# Altium schematic symbol library SparkFun.SCHLIB: 796 symbols (part 1 of 5)
Pins are listed as number, name and electrical type; pins without a type are passive.

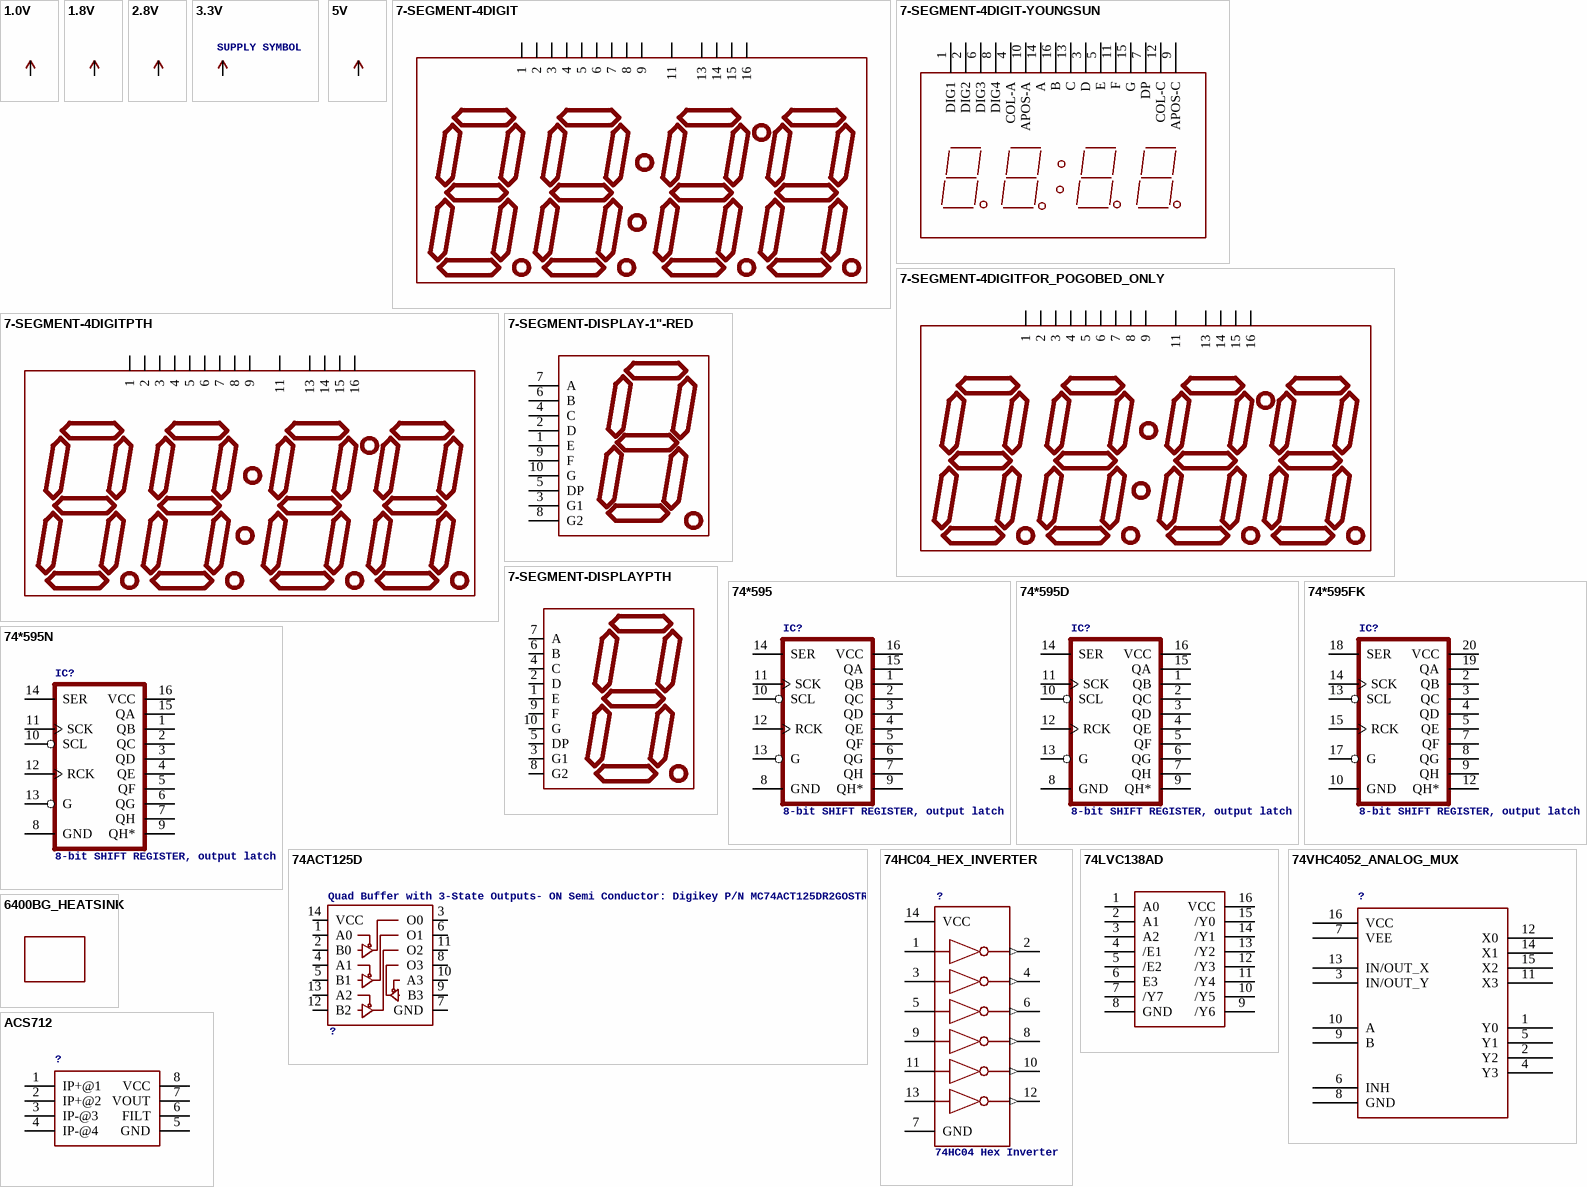
[diagram p0: symbols 1.0V to ACS712]

## 1.0V
designator ?
pins: ?1 1.0V (oe)

## 1.8V
designator ?
pins: ?1 1.8V (oe)

## 2.8V
designator ?
pins: ?1 2.8V (oe)

## 3.3V
designator P+?, comment SUPPLY SYMBOL
pins: ?1 3.3V (oe)

## 5V
designator ?
pins: ?1 5V (oe)

## 7-SEGMENT-4DIGIT
designator ?
footprint 7-SEGMENT-4DIGIT-YOUNGSUN
pins: 1, 2, 3, 4, 5, 6, 7, 8, 9, 11, 13, 14, 15, 16

## 7-SEGMENT-4DIGIT-YOUNGSUN
designator ?, comment This is a part for the 4-Digit 7-segment LEDs from Young Sun.  Different from the Digikey LEDs, all 16 pins are used.  (value not drawn)
footprint 7-SEGMENT-4DIGIT-YOUNGSUN
pins: 1 DIG1, 2 DIG2, 3 D, 4 COL-A, 5 E, 6 DIG3, 7 DP, 8 DIG4, 9 APOS-C, 10 APOS-A, 11 F, 12 COL-C, 13 C, 14 A, 15 G, 16 B

## 7-SEGMENT-4DIGITFOR_POGOBED_ONLY
designator ?
footprint 7-SEGMENT-4DIGIT_LONGPADS_FOR_POGOBED
pins: 1, 2, 3, 4, 5, 6, 7, 8, 9, 11, 13, 14, 15, 16

## 7-SEGMENT-4DIGITPTH
designator ?
footprint 7-SEGMENT-4DIGIT
pins: 1, 2, 3, 4, 5, 6, 7, 8, 9, 11, 13, 14, 15, 16

## 7-SEGMENT-DISPLAY-1"-RED
designator ?, comment 7-Segment Display 1" Red (COM-08546)  (value not drawn)
footprint 7-SEGMENT-1"PTH
pins: 1 E, 2 D, 3 G1, 4 C, 5 DP, 6 B, 7 A, 8 G2, 9 F, 10 G

## 7-SEGMENT-DISPLAYPTH
designator ?
footprint 7-SEGMENT-DISPLAY
pins: 1 E, 2 D, 3 G1, 4 C, 5 DP, 6 B, 7 A, 8 G2, 9 F, 10 G

## 74*595
designator IC?, comment 8-bit SHIFT REGISTER, output latch
footprint TSSOP16
pins: 1 QB (hiz), 2 QC (hiz), 3 QD (hiz), 4 QE (hiz), 5 QF (hiz), 6 QG (hiz), 7 QH (hiz), 8 GND (power), 9 QH* (hiz), 10 SCL, 11 SCK, 12 RCK, 13 G, 14 SER, 15 QA (hiz), 16 VCC (power)

## 74*595D
designator IC?, comment 8-bit SHIFT REGISTER, output latch
footprint SO16
pins: 1 QB (hiz), 2 QC (hiz), 3 QD (hiz), 4 QE (hiz), 5 QF (hiz), 6 QG (hiz), 7 QH (hiz), 8 GND (power), 9 QH* (hiz), 10 SCL, 11 SCK, 12 RCK, 13 G, 14 SER, 15 QA (hiz), 16 VCC (power)

## 74*595FK
designator IC?, comment 8-bit SHIFT REGISTER, output latch
footprint LCC20
pins: 2 QB (hiz), 3 QC (hiz), 4 QD (hiz), 5 QE (hiz), 7 QF (hiz), 8 QG (hiz), 9 QH (hiz), 10 GND (power), 12 QH* (hiz), 13 SCL, 14 SCK, 15 RCK, 17 G, 18 SER, 19 QA (hiz), 20 VCC (power)

## 74*595N
designator IC?, comment 8-bit SHIFT REGISTER, output latch
footprint DIL16
pins: 1 QB (hiz), 2 QC (hiz), 3 QD (hiz), 4 QE (hiz), 5 QF (hiz), 6 QG (hiz), 7 QH (hiz), 8 GND (power), 9 QH* (hiz), 10 SCL, 11 SCK, 12 RCK, 13 G, 14 SER, 15 QA (hiz), 16 VCC (power)

## 74ACT125D
designator ?, comment Quad Buffer with 3-State Outputs- ON Semi Conductor: Digikey P/N MC74ACT125DR2GOSTR-ND
footprint SO014
pins: 1 A0, 2 B0, 3 O0, 4 A1, 5 B1, 6 O1, 7 GND, 8 O3, 9 B3, 10 A3, 11 O2, 12 B2, 13 A2, 14 VCC

## 74HC04_HEX_INVERTER
designator ?, comment 74HC04 Hex Inverter
footprint DIL14
pins: 1 1A, 2 1Y (out), 3 2A, 4 2Y (out), 5 3A, 6 3Y (out), 7 GND (power), 8 4Y (out), 9 4A, 10 5Y (out), 11 5A, 12 6Y (out), 13 6A, 14 VCC (power)

## 74LVC138AD
designator ?
footprint SO016
pins: 1 A0, 2 A1, 3 A2, 4 /E1, 5 /E2, 6 E3, 7 /Y7, 8 GND, 9 /Y6, 10 /Y5, 11 /Y4, 12 /Y3, 13 /Y2, 14 /Y1, 15 /Y0, 16 VCC

## 74VHC4052_ANALOG_MUX
designator ?
footprint TSSOP16
pins: 1 Y0, 2 Y2, 3 IN/OUT_Y, 4 Y3, 5 Y1, 6 INH, 7 VEE, 8 GND, 9 B, 10 A, 11 X3, 12 X0, 13 IN/OUT_X, 14 X1, 15 X2, 16 VCC

## 6400BG_HEATSINK
designator ?
footprint 6400BG_HEATSINK

## ACS712
designator ?
footprint SO08
pins: 1 IP+@1, 2 IP+@2, 3 IP-@3, 4 IP-@4, 5 GND, 6 FILT, 7 VOUT, 8 VCC

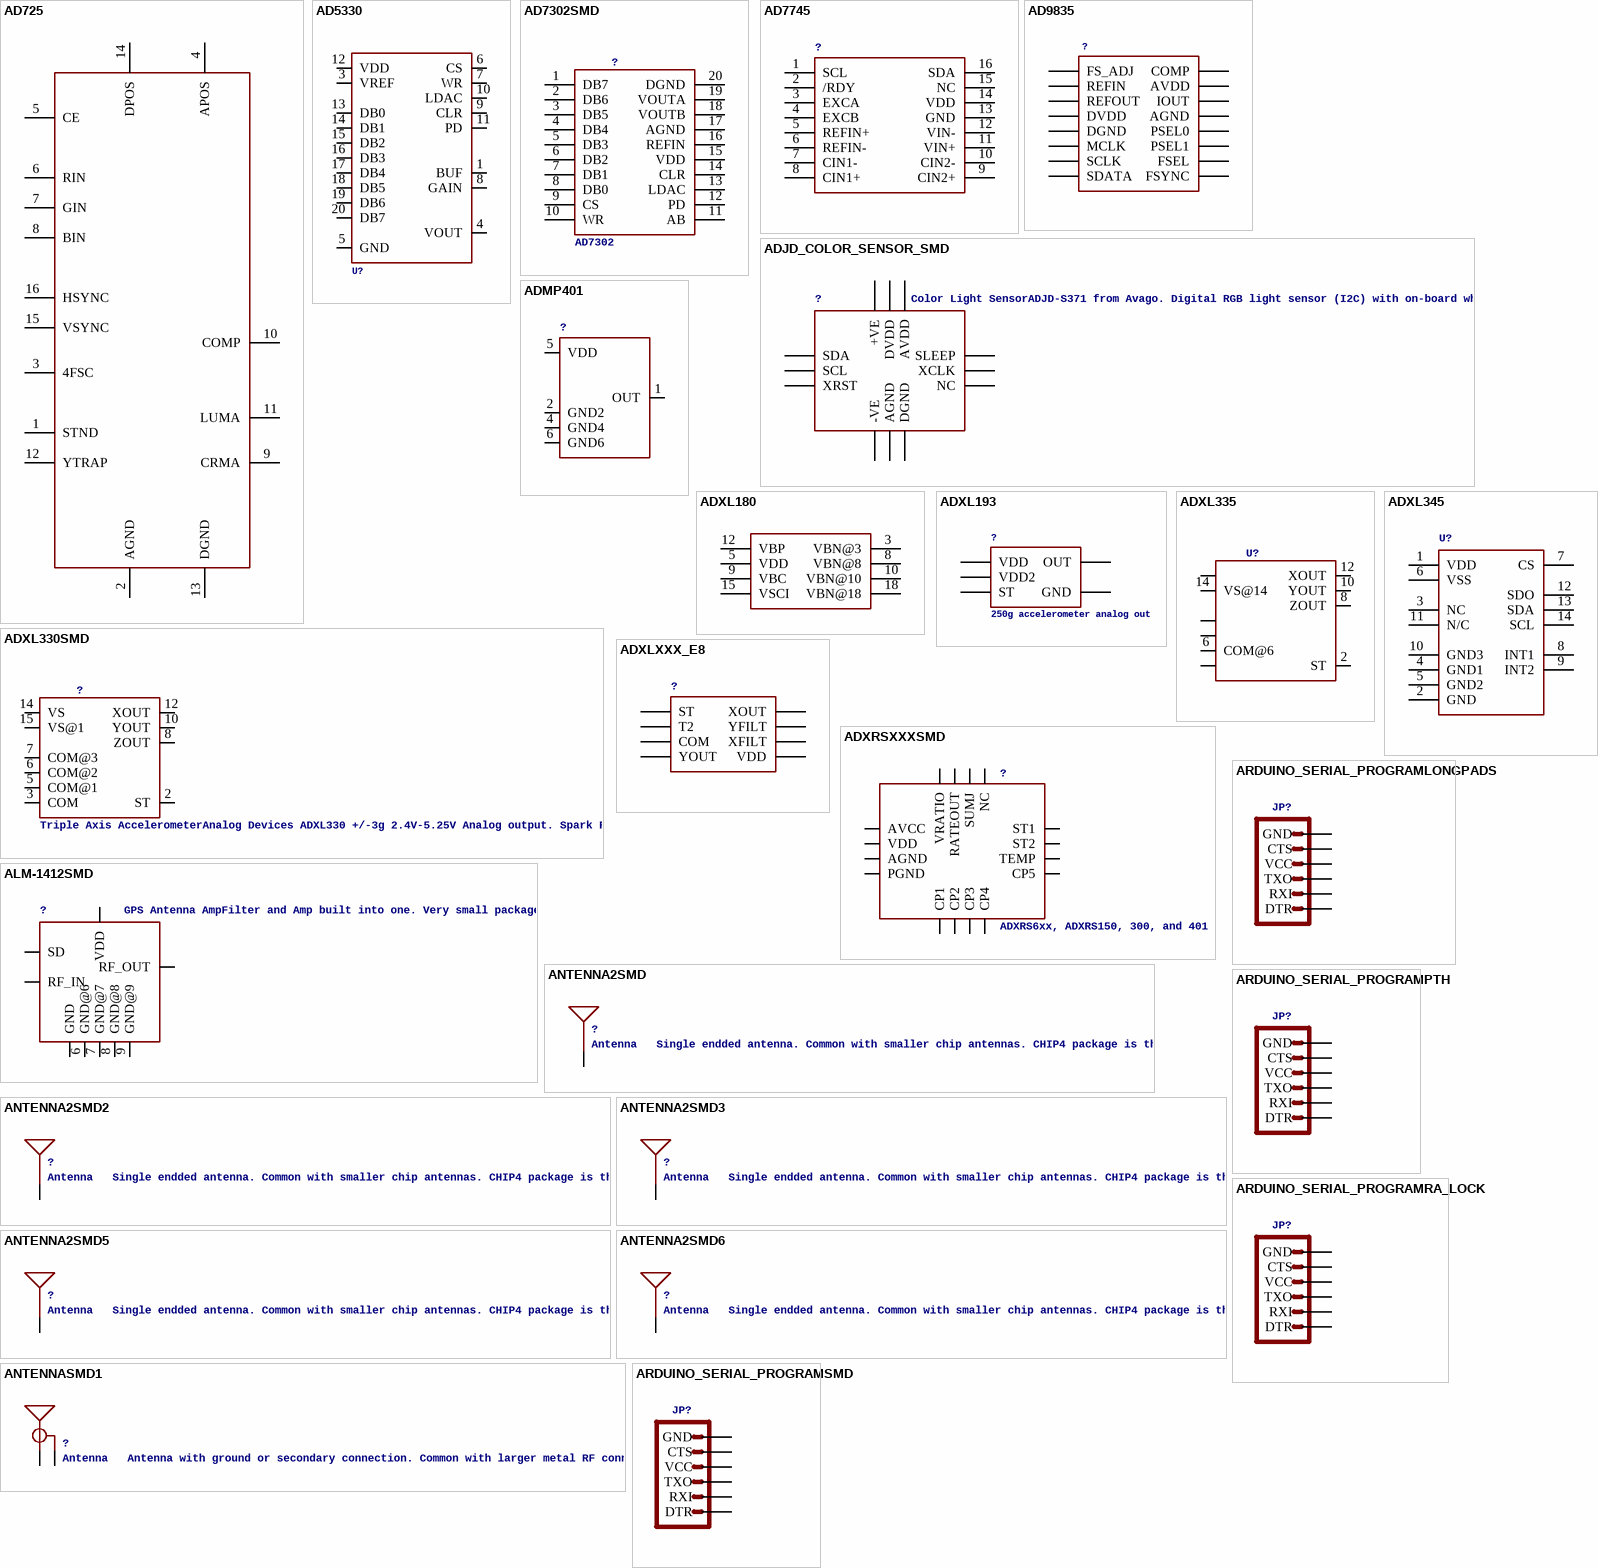
[diagram p1: symbols AD725 to ARDUINO_SERIAL_PROGRAMSMD]

## AD725
designator ?
footprint SO16L
pins: 1 STND, 2 AGND, 3 4FSC, 4 APOS, 5 CE, 6 RIN, 7 GIN, 8 BIN, 9 CRMA, 10 COMP, 11 LUMA, 12 YTRAP, 13 DGND, 14 DPOS, 15 VSYNC, 16 HSYNC

## AD5330
designator U?
footprint TSSOP20
pins: 1 BUF, 3 VREF, 4 VOUT, 5 GND, 6 CS, 7 WR, 8 GAIN, 9 CLR, 10 LDAC, 11 PD, 12 VDD, 13 DB0, 14 DB1, 15 DB2, 16 DB3, 17 DB4, 18 DB5, 19 DB6, 20 DB7

## AD7302SMD
designator ?, comment AD7302
footprint TSSOP20
pins: 1 DB7, 2 DB6, 3 DB5, 4 DB4, 5 DB3, 6 DB2, 7 DB1, 8 DB0, 9 CS, 10 WR, 11 AB, 12 PD, 13 LDAC, 14 CLR, 15 VDD, 16 REFIN, 17 AGND, 18 VOUTB, 19 VOUTA, 20 DGND

## AD7745
designator ?
footprint TSSOP16
pins: 1 SCL, 2 /RDY, 3 EXCA, 4 EXCB, 5 REFIN+, 6 REFIN-, 7 CIN1-, 8 CIN1+, 9 CIN2+, 10 CIN2-, 11 VIN+, 12 VIN-, 13 GND, 14 VDD, 15 NC, 16 SDA

## AD9835
designator ?
footprint TSSOP16
pins: 1 FS_ADJ, 2 REFIN, 3 REFOUT, 4 DVDD, 5 DGND, 6 MCLK, 7 SCLK, 8 SDATA, 9 FSYNC, 10 FSEL, 11 PSEL1, 12 PSEL0, 13 AGND, 14 IOUT, 15 AVDD, 16 COMP

## ADJD_COLOR_SENSOR_SMD
designator ?, comment Color Light SensorADJD-S371 from Avago. Digital RGB light sensor (I2C) with on-board white LED. Not quite proven footprint or schematic component. SKU: COM-08618
footprint ADJD-S371
pins: 1 -VE, 2 NC, 3 +VE, 4 SDA, 5 DVDD, 6 SCL, 7 AVDD, 8 SLEEP, 9 AGND, 10 XRST, 11 DGND, 12 XCLK

## ADMP401
designator ?
footprint ADMP401
pins: 1 OUT, 2 GND2, 4 GND4, 5 VDD, 6 GND6

## ADXL180
designator ?
footprint ADXL180
pins: 3 VBN@3, 5 VDD, 8 VBN@8, 9 VBC, 10 VBN@10, 12 VBP, 15 VSCI, 18 VBN@18

## ADXL193
designator ?, comment 250g accelerometer analog out
footprint ADXL193
pins: P$3 GND, P$4 ST, P$6 OUT, P$7 VDD, P$8 VDD2

## ADXL330SMD
designator ?, comment Triple Axis AccelerometerAnalog Devices ADXL330 +/-3g 2.4V-5.25V Analog output. Spark Fun Electronics SKU : COM-00730. Center pad paste layer has been reduced to avoid shorting.
footprint LFCSP-16
pins: 2 ST, 3 COM, 5 COM@1, 6 COM@2, 7 COM@3, 8 ZOUT, 10 YOUT, 12 XOUT, 14 VS, 15 VS@1

## ADXL335
designator U?
footprint LFCSP-16
pins: 2 ST, 3 COM@3, 5 COM@5, 6 COM@6, 7 COM@7, 8 ZOUT, 10 YOUT, 12 XOUT, 14 VS@14, 15 VS@15

## ADXL345
designator U?
footprint LGA14
pins: 1 VDD, 2 GND, 3 NC, 4 GND1, 5 GND2, 6 VSS, 7 CS, 8 INT1, 9 INT2, 10 GND3, 11 N/C, 12 SDO, 13 SDA, 14 SCL

## ADXLXXX_E8
designator ?
footprint ADXLXXX_E8
pins: P$1 ST, P$2 T2, P$3 COM, P$4 YOUT, P$5 XOUT, P$6 YFILT, P$7 XFILT, P$8 VDD

## ADXRSXXXSMD
designator ?, comment ADXRS6xx, ADXRS150, 300, and 401
footprint BC-32
pins: AGND, AVCC, CP1, CP2, CP3, CP4, CP5, NC, PGND, RATEOUT, ST1, ST2, SUMJ, TEMP, VDD, VRATIO

## ALM-1412SMD
designator ?, comment GPS Antenna AmpFilter and Amp built into one. Very small package.
footprint ALM-1412
pins: 1 SD, 2 GND, 3 RF_OUT, 4 VDD, 5 RF_IN, 6 GND@6, 7 GND@7, 8 GND@8, 9 GND@9

## ANTENNA2SMD
designator ?, comment Antenna   Single endded antenna. Common with smaller chip antennas. CHIP4 package is the GPS Chip Antenna SKU: GPS-08418. CHIP5 package is 2.4GHz chip antenna SKU: WRL-00144.
footprint ANTENNA-CHIP2
pins: FEED SIGNAL

## ANTENNA2SMD2
designator ?, comment Antenna   Single endded antenna. Common with smaller chip antennas. CHIP4 package is the GPS Chip Antenna SKU: GPS-08418. CHIP5 package is 2.4GHz chip antenna SKU: WRL-00144.
footprint ANTENNA-CHIP3
pins: FEED SIGNAL

## ANTENNA2SMD3
designator ?, comment Antenna   Single endded antenna. Common with smaller chip antennas. CHIP4 package is the GPS Chip Antenna SKU: GPS-08418. CHIP5 package is 2.4GHz chip antenna SKU: WRL-00144.
footprint ANTENNA-CHIP4
pins: SIG SIGNAL

## ANTENNA2SMD5
designator ?, comment Antenna   Single endded antenna. Common with smaller chip antennas. CHIP4 package is the GPS Chip Antenna SKU: GPS-08418. CHIP5 package is 2.4GHz chip antenna SKU: WRL-00144.
footprint ANTENNA-CHIP5
pins: FEED SIGNAL

## ANTENNA2SMD6
designator ?, comment Antenna   Single endded antenna. Common with smaller chip antennas. CHIP4 package is the GPS Chip Antenna SKU: GPS-08418. CHIP5 package is 2.4GHz chip antenna SKU: WRL-00144.
footprint ANTENNA-CHIP6
pins: 1 SIGNAL

## ANTENNASMD1
designator ?, comment Antenna   Antenna with ground or secondary connection. Common with larger metal RF connectors.
footprint ANTENNA-CHIP
pins: FEED SIGNAL, GND

## ARDUINO_SERIAL_PROGRAMLONGPADS
designator JP?
footprint 1X06_LONGPADS
pins: 1 DTR, 2 RXI, 3 TXO, 4 VCC, 5 CTS, 6 GND

## ARDUINO_SERIAL_PROGRAMPTH
designator JP?
footprint 1X06
pins: 1 DTR, 2 RXI, 3 TXO, 4 VCC, 5 CTS, 6 GND

## ARDUINO_SERIAL_PROGRAMRA_LOCK
designator JP?
footprint MOLEX-1X6-RA_LOCK
pins: 1 GND, 2 CTS, 3 VCC, 4 TXO, 5 RXI, 6 DTR

## ARDUINO_SERIAL_PROGRAMSMD
designator JP?
footprint 1X06-SMD
pins: 1 DTR, 2 RXI, 3 TXO, 4 VCC, 5 CTS, 6 GND

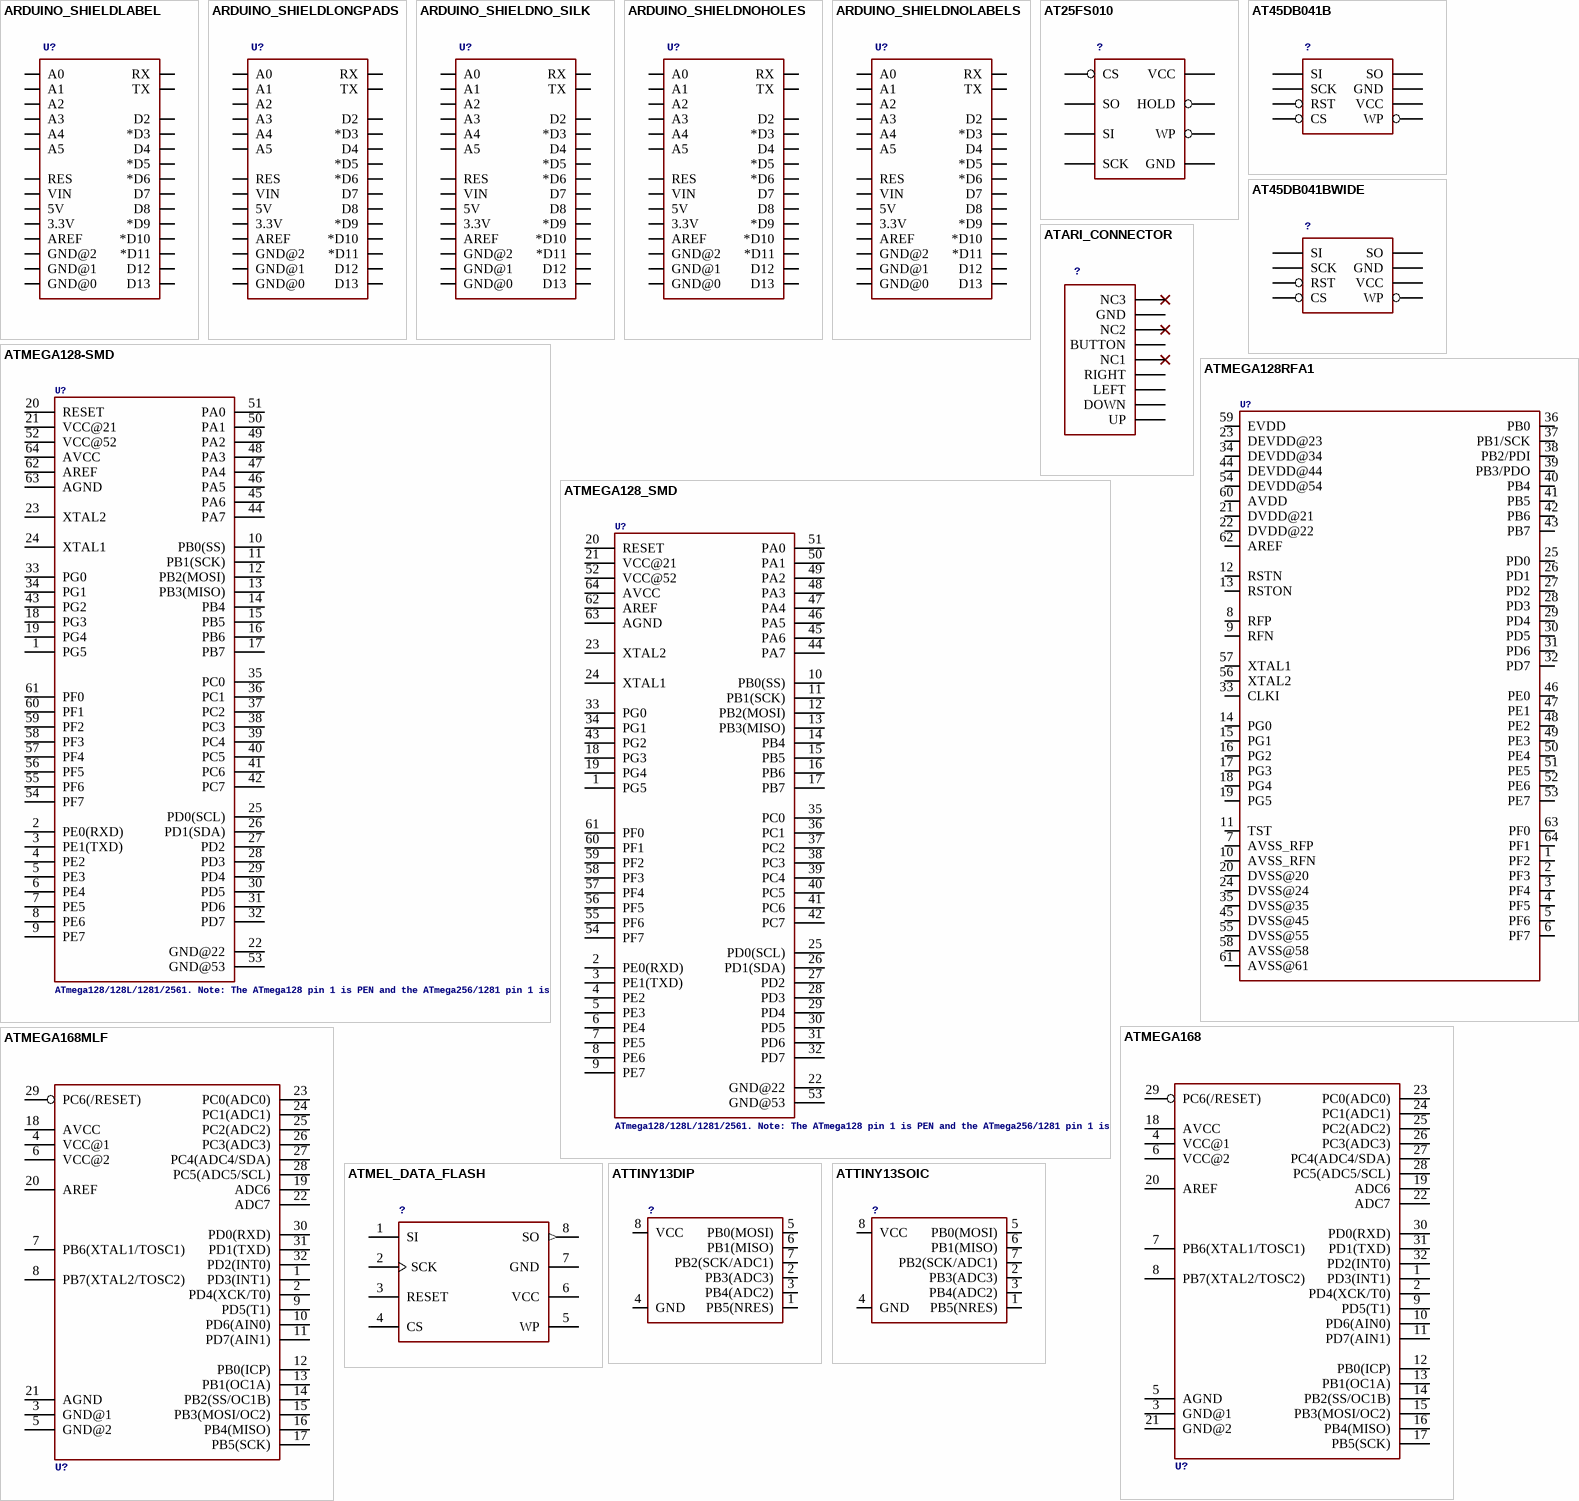
[diagram p2: symbols ARDUINO_SHIELDLABEL to ATTINY13SOIC]

## ARDUINO_SHIELDLABEL
designator U?
footprint DUEMILANOVE_SHIELD
pins: 3.3V, 5V, A0, A1, A2, A3, A4, A5, AREF, D2, D3 *D3, D4, D5 *D5, D6 *D6, D7, D8, D9 *D9, D10 *D10, D11 *D11, D12, D13, GND@0, GND@1, GND@2, RES, RX, TX, VIN

## ARDUINO_SHIELDLONGPADS
designator U?
footprint DUEMILANOVE_SHIELD_LONGPADS
pins: 3.3V, 5V, A0, A1, A2, A3, A4, A5, AREF, D2, D3 *D3, D4, D5 *D5, D6 *D6, D7, D8, D9 *D9, D10 *D10, D11 *D11, D12, D13, GND@0, GND@1, GND@2, RES, RX, TX, VIN

## ARDUINO_SHIELDNO_SILK
designator U?
footprint DUEMILANOVE_VIAS
pins: 3.3V, 5V, A0, A1, A2, A3, A4, A5, AREF, D2, D3 *D3, D4, D5 *D5, D6 *D6, D7, D8, D9 *D9, D10 *D10, D11 *D11, D12, D13, GND@0, GND@1, GND@2, RES, RX, TX, VIN

## ARDUINO_SHIELDNOHOLES
designator U?
footprint DUEMILANOVE_SHIELD_NOHOLES
pins: 3.3V, 5V, A0, A1, A2, A3, A4, A5, AREF, D2, D3 *D3, D4, D5 *D5, D6 *D6, D7, D8, D9 *D9, D10 *D10, D11 *D11, D12, D13, GND@0, GND@1, GND@2, RES, RX, TX, VIN

## ARDUINO_SHIELDNOLABELS
designator U?
footprint DUEMILANOVE_SHIELD_NOLABELS
pins: 3.3V, 5V, A0, A1, A2, A3, A4, A5, AREF, D2, D3 *D3, D4, D5 *D5, D6 *D6, D7, D8, D9 *D9, D10 *D10, D11 *D11, D12, D13, GND@0, GND@1, GND@2, RES, RX, TX, VIN

## AT25FS010
designator ?
footprint SO08WIDE
pins: 1 CS, 2 SO, 3 WP, 4 GND, 5 SI, 6 SCK, 7 HOLD, 8 VCC

## AT45DB041B
designator ?
footprint SO08
pins: 1 SI, 2 SCK, 3 RST, 4 CS, 5 WP, 6 VCC, 7 GND, 8 SO

## AT45DB041BWIDE
designator ?
footprint SO08WIDE
pins: 1 SI, 2 SCK, 3 RST, 4 CS, 5 WP, 6 VCC, 7 GND, 8 SO

## ATARI_CONNECTOR
designator ?
footprint ATARI_CONNECTOR
pins: P$1 BUTTON, P$2 NC2, P$3 GND, P$4 NC3, P$5 UP, P$6 DOWN, P$7 LEFT, P$8 RIGHT, P$9 NC1

## ATMEGA128-SMD
designator U?, comment ATmega128/128L/1281/2561. Note: The ATmega128 pin 1 is PEN and the ATmega256/1281 pin 1 is PG5.
footprint TQFP64_14X14MM
pins: 1 PG5, 2 PE0(RXD), 3 PE1(TXD), 4 PE2, 5 PE3, 6 PE4, 7 PE5, 8 PE6, 9 PE7, 10 PB0(SS), 11 PB1(SCK), 12 PB2(MOSI), 13 PB3(MISO), 14 PB4, 15 PB5, 16 PB6, 17 PB7, 18 PG3, 19 PG4, 20 RESET, 21 VCC@21, 22 GND@22, 23 XTAL2, 24 XTAL1, 25 PD0(SCL), 26 PD1(SDA), 27 PD2, 28 PD3, 29 PD4, 30 PD5, 31 PD6, 32 PD7, 33 PG0, 34 PG1, 35 PC0, 36 PC1, 37 PC2, 38 PC3, 39 PC4, 40 PC5, 41 PC6, 42 PC7, 43 PG2, 44 PA7, 45 PA6, 46 PA5, 47 PA4, 48 PA3, 49 PA2, 50 PA1, 51 PA0, 52 VCC@52, 53 GND@53, 54 PF7, 55 PF6, 56 PF5, 57 PF4, 58 PF3, 59 PF2, 60 PF1, 61 PF0, 62 AREF, 63 AGND, 64 AVCC

## ATMEGA128_SMD
designator U?, comment ATmega128/128L/1281/2561. Note: The ATmega128 pin 1 is PEN and the ATmega256/1281 pin 1 is PG5.
footprint TQFP64
pins: 1 PG5, 2 PE0(RXD), 3 PE1(TXD), 4 PE2, 5 PE3, 6 PE4, 7 PE5, 8 PE6, 9 PE7, 10 PB0(SS), 11 PB1(SCK), 12 PB2(MOSI), 13 PB3(MISO), 14 PB4, 15 PB5, 16 PB6, 17 PB7, 18 PG3, 19 PG4, 20 RESET, 21 VCC@21, 22 GND@22, 23 XTAL2, 24 XTAL1, 25 PD0(SCL), 26 PD1(SDA), 27 PD2, 28 PD3, 29 PD4, 30 PD5, 31 PD6, 32 PD7, 33 PG0, 34 PG1, 35 PC0, 36 PC1, 37 PC2, 38 PC3, 39 PC4, 40 PC5, 41 PC6, 42 PC7, 43 PG2, 44 PA7, 45 PA6, 46 PA5, 47 PA4, 48 PA3, 49 PA2, 50 PA1, 51 PA0, 52 VCC@52, 53 GND@53, 54 PF7, 55 PF6, 56 PF5, 57 PF4, 58 PF3, 59 PF2, 60 PF1, 61 PF0, 62 AREF, 63 AGND, 64 AVCC

## ATMEGA128RFA1
designator U?
footprint QFN-64
pins: 1 PF2, 2 PF3, 3 PF4, 4 PF5, 5 PF6, 6 PF7, 7 AVSS_RFP, 8 RFP, 9 RFN, 10 AVSS_RFN, 11 TST, 12 RSTN, 13 RSTON, 14 PG0, 15 PG1, 16 PG2, 17 PG3, 18 PG4, 19 PG5, 20 DVSS@20, 21 DVDD@21, 22 DVDD@22, 23 DEVDD@23, 24 DVSS@24, 25 PD0, 26 PD1, 27 PD2, 28 PD3, 29 PD4, 30 PD5, 31 PD6, 32 PD7, 33 CLKI, 34 DEVDD@34, 35 DVSS@35, 36 PB0, 37 PB1/SCK, 38 PB2/PDI, 39 PB3/PDO, 40 PB4, 41 PB5, 42 PB6, 43 PB7, 44 DEVDD@44, 45 DVSS@45, 46 PE0, 47 PE1, 48 PE2, 49 PE3, 50 PE4, 51 PE5, 52 PE6, 53 PE7, 54 DEVDD@54, 55 DVSS@55, 56 XTAL2, 57 XTAL1, 58 AVSS@58, 59 EVDD, 60 AVDD, 61 AVSS@61, 62 AREF, 63 PF0, 64 PF1

## ATMEGA168
designator U?
footprint TQFP32-08
pins: 1 PD3(INT1), 2 PD4(XCK/T0), 3 GND@1, 4 VCC@1, 5 AGND, 6 VCC@2, 7 PB6(XTAL1/TOSC1), 8 PB7(XTAL2/TOSC2), 9 PD5(T1), 10 PD6(AIN0), 11 PD7(AIN1), 12 PB0(ICP), 13 PB1(OC1A), 14 PB2(SS/OC1B), 15 PB3(MOSI/OC2), 16 PB4(MISO), 17 PB5(SCK), 18 AVCC, 19 ADC6, 20 AREF, 21 GND@2, 22 ADC7, 23 PC0(ADC0), 24 PC1(ADC1), 25 PC2(ADC2), 26 PC3(ADC3), 27 PC4(ADC4/SDA), 28 PC5(ADC5/SCL), 29 PC6(/RESET), 30 PD0(RXD), 31 PD1(TXD), 32 PD2(INT0)

## ATMEGA168MLF
designator U?
footprint MLF32
pins: 1 PD3(INT1), 2 PD4(XCK/T0), 3 GND@1, 4 VCC@1, 5 GND@2, 6 VCC@2, 7 PB6(XTAL1/TOSC1), 8 PB7(XTAL2/TOSC2), 9 PD5(T1), 10 PD6(AIN0), 11 PD7(AIN1), 12 PB0(ICP), 13 PB1(OC1A), 14 PB2(SS/OC1B), 15 PB3(MOSI/OC2), 16 PB4(MISO), 17 PB5(SCK), 18 AVCC, 19 ADC6, 20 AREF, 21 AGND, 22 ADC7, 23 PC0(ADC0), 24 PC1(ADC1), 25 PC2(ADC2), 26 PC3(ADC3), 27 PC4(ADC4/SDA), 28 PC5(ADC5/SCL), 29 PC6(/RESET), 30 PD0(RXD), 31 PD1(TXD), 32 PD2(INT0)

## ATMEL_DATA_FLASH
designator ?, comment 16Mbit EEPROM DataFlashFootprint needs touching up. Spark Fun Electronics SKU : COM-00301  (value not drawn)
footprint SO08WIDE
pins: 1 SI, 2 SCK, 3 RESET, 4 CS, 5 WP, 6 VCC (power), 7 GND (power), 8 SO (out)

## ATTINY13DIP
designator ?
footprint DIP08
pins: 1 PB5(NRES), 2 PB3(ADC3), 3 PB4(ADC2), 4 GND, 5 PB0(MOSI), 6 PB1(MISO), 7 PB2(SCK/ADC1), 8 VCC

## ATTINY13SOIC
designator ?
footprint SO08
pins: 1 PB5(NRES), 2 PB3(ADC3), 3 PB4(ADC2), 4 GND, 5 PB0(MOSI), 6 PB1(MISO), 7 PB2(SCK/ADC1), 8 VCC

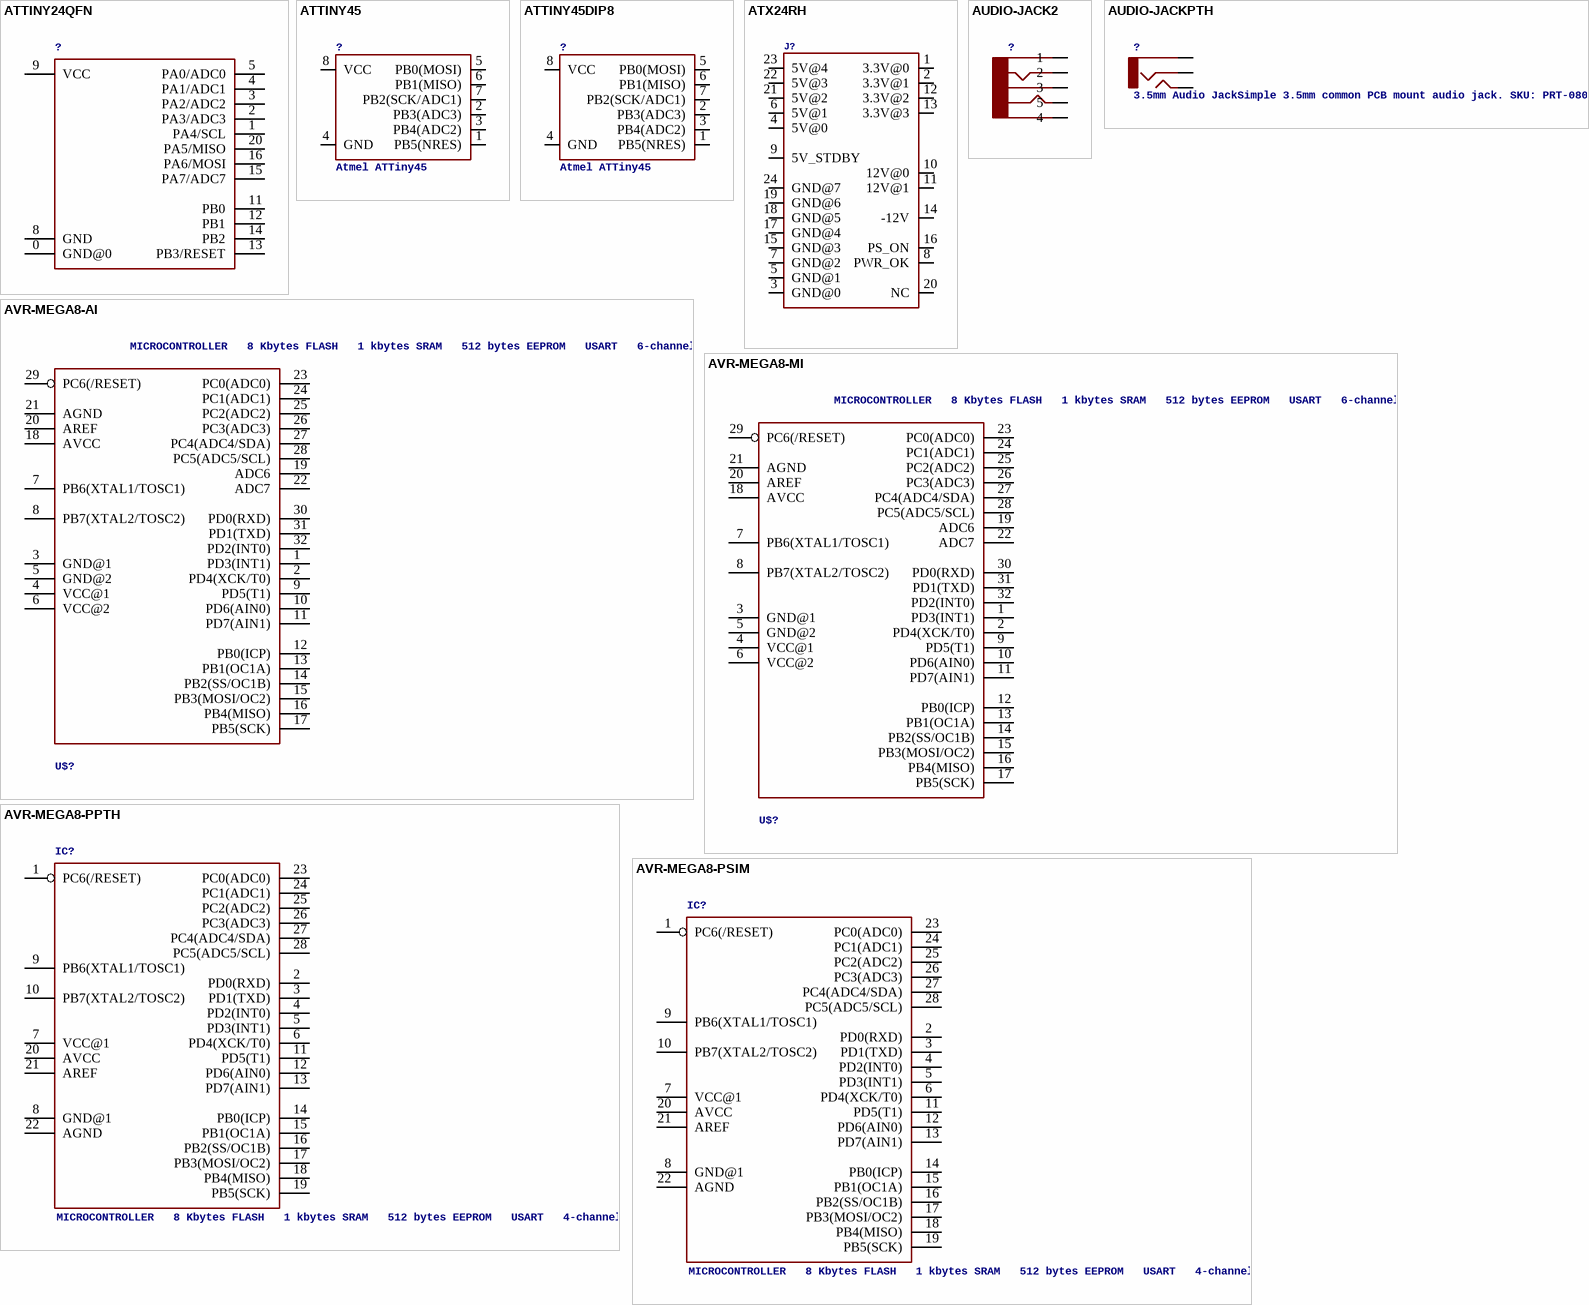
[diagram p3: symbols ATTINY24QFN to AVR-MEGA8-PSIM]

## ATTINY24QFN
designator ?
footprint QFN20
pins: 0 GND@0, 1 PA4/SCL, 2 PA3/ADC3, 3 PA2/ADC2, 4 PA1/ADC1, 5 PA0/ADC0, 8 GND, 9 VCC, 11 PB0, 12 PB1, 13 PB3/RESET, 14 PB2, 15 PA7/ADC7, 16 PA6/MOSI, 20 PA5/MISO

## ATTINY45
designator ?, comment Atmel ATTiny45
footprint SO08-EIAJ
pins: 1 PB5(NRES), 2 PB3(ADC3), 3 PB4(ADC2), 4 GND, 5 PB0(MOSI), 6 PB1(MISO), 7 PB2(SCK/ADC1), 8 VCC

## ATTINY45DIP8
designator ?, comment Atmel ATTiny45
footprint DIP08
pins: 1 PB5(NRES), 2 PB3(ADC3), 3 PB4(ADC2), 4 GND, 5 PB0(MOSI), 6 PB1(MISO), 7 PB2(SCK/ADC1), 8 VCC

## ATX24RH
designator J?
footprint ATX24_RIGHT_ANGLE
pins: 1 3.3V@0, 2 3.3V@1, 3 GND@0, 4 5V@0, 5 GND@1, 6 5V@1, 7 GND@2, 8 PWR_OK, 9 5V_STDBY, 10 12V@0, 11 12V@1, 12 3.3V@2, 13 3.3V@3, 14 -12V, 15 GND@3, 16 PS_ON, 17 GND@4, 18 GND@5, 19 GND@6, 20 NC, 21 5V@2, 22 5V@3, 23 5V@4, 24 GND@7

## AUDIO-JACK2
designator ?
footprint AUDIO-JACK
pins: 1, 2, 3, 4, 5

## AUDIO-JACKPTH
designator ?, comment 3.5mm Audio JackSimple 3.5mm common PCB mount audio jack. SKU: PRT-08032
footprint AUDIO-JACK
pins: 1, 2, 5

## AVR-MEGA8-AI
designator U$?, comment MICROCONTROLLER   8 Kbytes FLASH   1 kbytes SRAM   512 bytes EEPROM   USART   6-channel 10 bit ADC   2-channel 8 bit ADC
footprint TQFP32-08
pins: 1 PD3(INT1), 2 PD4(XCK/T0), 3 GND@1, 4 VCC@1, 5 GND@2, 6 VCC@2, 7 PB6(XTAL1/TOSC1), 8 PB7(XTAL2/TOSC2), 9 PD5(T1), 10 PD6(AIN0), 11 PD7(AIN1), 12 PB0(ICP), 13 PB1(OC1A), 14 PB2(SS/OC1B), 15 PB3(MOSI/OC2), 16 PB4(MISO), 17 PB5(SCK), 18 AVCC, 19 ADC6, 20 AREF, 21 AGND, 22 ADC7, 23 PC0(ADC0), 24 PC1(ADC1), 25 PC2(ADC2), 26 PC3(ADC3), 27 PC4(ADC4/SDA), 28 PC5(ADC5/SCL), 29 PC6(/RESET), 30 PD0(RXD), 31 PD1(TXD), 32 PD2(INT0)

## AVR-MEGA8-MI
designator U$?, comment MICROCONTROLLER   8 Kbytes FLASH   1 kbytes SRAM   512 bytes EEPROM   USART   6-channel 10 bit ADC   2-channel 8 bit ADC
footprint MLF32
pins: 1 PD3(INT1), 2 PD4(XCK/T0), 3 GND@1, 4 VCC@1, 5 GND@2, 6 VCC@2, 7 PB6(XTAL1/TOSC1), 8 PB7(XTAL2/TOSC2), 9 PD5(T1), 10 PD6(AIN0), 11 PD7(AIN1), 12 PB0(ICP), 13 PB1(OC1A), 14 PB2(SS/OC1B), 15 PB3(MOSI/OC2), 16 PB4(MISO), 17 PB5(SCK), 18 AVCC, 19 ADC6, 20 AREF, 21 AGND, 22 ADC7, 23 PC0(ADC0), 24 PC1(ADC1), 25 PC2(ADC2), 26 PC3(ADC3), 27 PC4(ADC4/SDA), 28 PC5(ADC5/SCL), 29 PC6(/RESET), 30 PD0(RXD), 31 PD1(TXD), 32 PD2(INT0)

## AVR-MEGA8-PPTH
designator IC?, comment MICROCONTROLLER   8 Kbytes FLASH   1 kbytes SRAM   512 bytes EEPROM   USART   4-channel 10 bit ADC   2-channel 8 bit ADC
footprint DIL28-3
pins: 1 PC6(/RESET), 2 PD0(RXD), 3 PD1(TXD), 4 PD2(INT0), 5 PD3(INT1), 6 PD4(XCK/T0), 7 VCC@1, 8 GND@1, 9 PB6(XTAL1/TOSC1), 10 PB7(XTAL2/TOSC2), 11 PD5(T1), 12 PD6(AIN0), 13 PD7(AIN1), 14 PB0(ICP), 15 PB1(OC1A), 16 PB2(SS/OC1B), 17 PB3(MOSI/OC2), 18 PB4(MISO), 19 PB5(SCK), 20 AVCC, 21 AREF, 22 AGND, 23 PC0(ADC0), 24 PC1(ADC1), 25 PC2(ADC2), 26 PC3(ADC3), 27 PC4(ADC4/SDA), 28 PC5(ADC5/SCL)

## AVR-MEGA8-PSIM
designator IC?, comment MICROCONTROLLER   8 Kbytes FLASH   1 kbytes SRAM   512 bytes EEPROM   USART   4-channel 10 bit ADC   2-channel 8 bit ADC
footprint DIL28-3-SIMON
pins: 1 PC6(/RESET), 2 PD0(RXD), 3 PD1(TXD), 4 PD2(INT0), 5 PD3(INT1), 6 PD4(XCK/T0), 7 VCC@1, 8 GND@1, 9 PB6(XTAL1/TOSC1), 10 PB7(XTAL2/TOSC2), 11 PD5(T1), 12 PD6(AIN0), 13 PD7(AIN1), 14 PB0(ICP), 15 PB1(OC1A), 16 PB2(SS/OC1B), 17 PB3(MOSI/OC2), 18 PB4(MISO), 19 PB5(SCK), 20 AVCC, 21 AREF, 22 AGND, 23 PC0(ADC0), 24 PC1(ADC1), 25 PC2(ADC2), 26 PC3(ADC3), 27 PC4(ADC4/SDA), 28 PC5(ADC5/SCL)